# Altium integrated library My_Intlib.IntLib: 107 symbols (part 1 of 2) (continued)
## STM32F103V (continued)

## STM32F407ZE
designator U?
Flaah:512/RAM:192/IO:114; BOM名称: 32位ST单片机
footprint LQFP144 20X20_N (144脚，体宽20x20mm，脚距0.5mm)
pins: 1 FSMC_A23/PE2, 2 FSMC_A19/PE3, 3 FSMC_A20/PE4, 4 FSMC_A21/PE5, 5 FSMC_A22/PE6, 6 VBAT, 7 PC13, 8 PC14/OSC32_IN, 9 PC15/OSC32_OUT, 10 I2C2_SDA/FSMC_A0/PF0, 11 I2C2_SCL/FSMC_A1/PF1, 12 I2C2_SMBA/FSMC_A2/PF2, 13 FSMC_A3/PF3, 14 FSMC_A4/PF4, 15 FSMC_A5/PF5, 16 VSS, 17 VDD, 18 FSMC_NIORD/PF6, 19 FSMC_NREG/PF7, 20 FSMC_NIOWR/PF8, 21 FSMC_CD/PF9, 22 FSMC_INTR/PF10, 23 OSC_IN/PH0, 24 OSC_OUT/PH1, 25 NRST, 26 PC0, 27 PC1, 28 PC2/SPI2_MISO/I2S2ext_SD, 29 PC3/SPI2_MOSI/I2S2_SD, 30 VDD, 31 VSSA, 32 VREF+, 33 VDDA, 34 PA0/USART2_CTS/UART4_TX, 35 PA1/USART2_RTS/UART4_RX, 36 PA2/USART2_TX, 37 PA3/USART2_RX, 38 VSS, 39 VDD, 40 PA4/SPI1_NSS/SPI3_NSS/USART2_CK, 41 PA5/SPI1_SCK, 42 PA6/SPI1_MISO, 43 PA7/SPI1_MOSI, 44 PC4, 45 PC5, 46 PB0, 47 PB1, 48 PB2/BOOT1, 49 PF11, 50 FSMC_A6/PF12, 51 VSS, 52 VDD, 53 FSMC_A7/PF13, 54 FSMC_A8/PF14, 55 FSMC_A9/PF15, 56 FSMC_A10/PG0, 57 FSMC_A11/PG1, 58 FSMC_D4/PE7, 59 FSMC_D5/PE8, 60 FSMC_D6/PE9, 61 VSS, 62 VDD, 63 FSMC_D7/PE10, 64 FSMC_D8/PE11, 65 FSMC_D9/PE12, 66 FSMC_D10/PE13, 67 FSMC_D11/PE14, 68 FSMC_D12/PE15, 69 PB10/SPI2_SCK/I2S2_CK/I2C2_SCL/USART3_TX, 70 PB11/I2C2_SDA/USART3_RX, 71 VCAP_1, 72 VDD, 73 PB12/SPI2_NSS/I2S2_WS/I2C2_SMBA/USART3_CK/CNA2_RX, 74 PB13/SPI2_SCK/I2S2_CK/USART3_CTS/CAN2_TX, 75 PB14/SPI2_MISO/USART3_RTS, 76 PB15/SPI2_MOSI/I2S2_SD, 77 PD8/FSMC_D13/USART3_TX, 78 PD9/FSMC_D14/USART3_RX, 79 PD10/FSMC_D15/USART3_CK, 80 PD11/FSMC_CLE/FSMC_A16/USART3_CTS, 81 PD12/FSMC_ALE/FSMC_A17/USART3_RTS, 82 PD13/FSMC_A18, 83 VSS, 84 VDD, 85 PD14/FSMC_D0, 86 PD15/FSMC_D1, 87 FSMC_A12/PG2, 88 FSMC_A13/PG3, 89 FSMC_A14/PG4, 90 FSMC_A15/PG5, 91 FSMC_INT2/PG6, 92 USART6_CK/FSMC_INT3/PG7, 93 USART6_RTS/PG8, 94 VSS, 95 VDD, 96 PC6/I2S2_MCK/USART6_TX, 97 PC7/I2S3_MCK/USART6_RX, 98 PC8/USART6_CK, 99 PC9/I2S_CKIN/I2C3_SDA, 100 PA8/USART1_CK, 101 PA9/USART1_TX/I2C3_SMBA, 102 PA10/USART1_RX, 103 PA11/USART1_CTS/CAN1_RX, 104 PA12/USART1_RTS/CAN1_TX, 105 PA13/SWDIO, 106 VCAP_2, 107 VSS, 108 VDD, 109 PA14/SWCLK, 110 PA15/SPI3_NSS/I2S3_WS, 111 PC10/SPI3_SCK/I2S3_CK/UART4_TX/USART3_TX, 112 PC11/SPI3_MISO/I2S3ext_SD/UART4_RX/USART3_RX, 113 PC12/SPI3_MOSI/I2S3_SD/UART5_TX/USART3_CK, 114 PD0/FSMC_D2/CAN1_RX, 115 PD1/FSMC_D2/CAN1_TX, 116 PD2/UART5_RX, 117 PD3/FSMC_CLK/USART2_CTS, 118 PD4/FSMC_NOE/USART2_RTS, 119 PD5/FSMC_NWE/USART2_TX, 120 VSS, 121 VDD, 122 PD6/FSMC_NWAIT/USART2_RX, 123 PD7/FSMC_NE1/FSMC_NCE2/USART2_CK, 124 USART6_RX/FSMC_NE2/FSMC_NCE3/PG9, 125 FSMC_NCE4_1/FSMC_NE3/PG10, 126 FSMC_NCE4_2/PG11, 127 USART6_RTS/FSMC_NE4/PG12, 128 USART6_CTS/FSMC_A24/PG13, 129 USART6_TX/FSMC_A25/PG14, 130 VSS, 131 VDD, 132 USART6_CTS/PG15, 133 PB3/SPI3_SCK/I2S3_CK/SPI1_SCK, 134 PB4/SPI3_MISO/SPI1_MISO/I2S3ext_SD, 135 PB5/I2C1_SMBA/CAN2_RX/SPI1_MOSI/SPI3_MOSI/I2S3_SD, 136 PB6/I2C1_SCL/CAN2_TX/USART1_TX, 137 PB7/I2C1_SDA/FSMC_NL/USART1_RX, 138 BOOT0, 139 PB8/I2C1_SCL/CAN1_RX, 140 PB9/SPI2_NSS/I2S2_WS/I2C1_SDA/CAN1_TX, 141 FSMC_NBL0/PE0, 142 FSMC_NBL1/PE1, 143 PDR_ON, 144 VDD

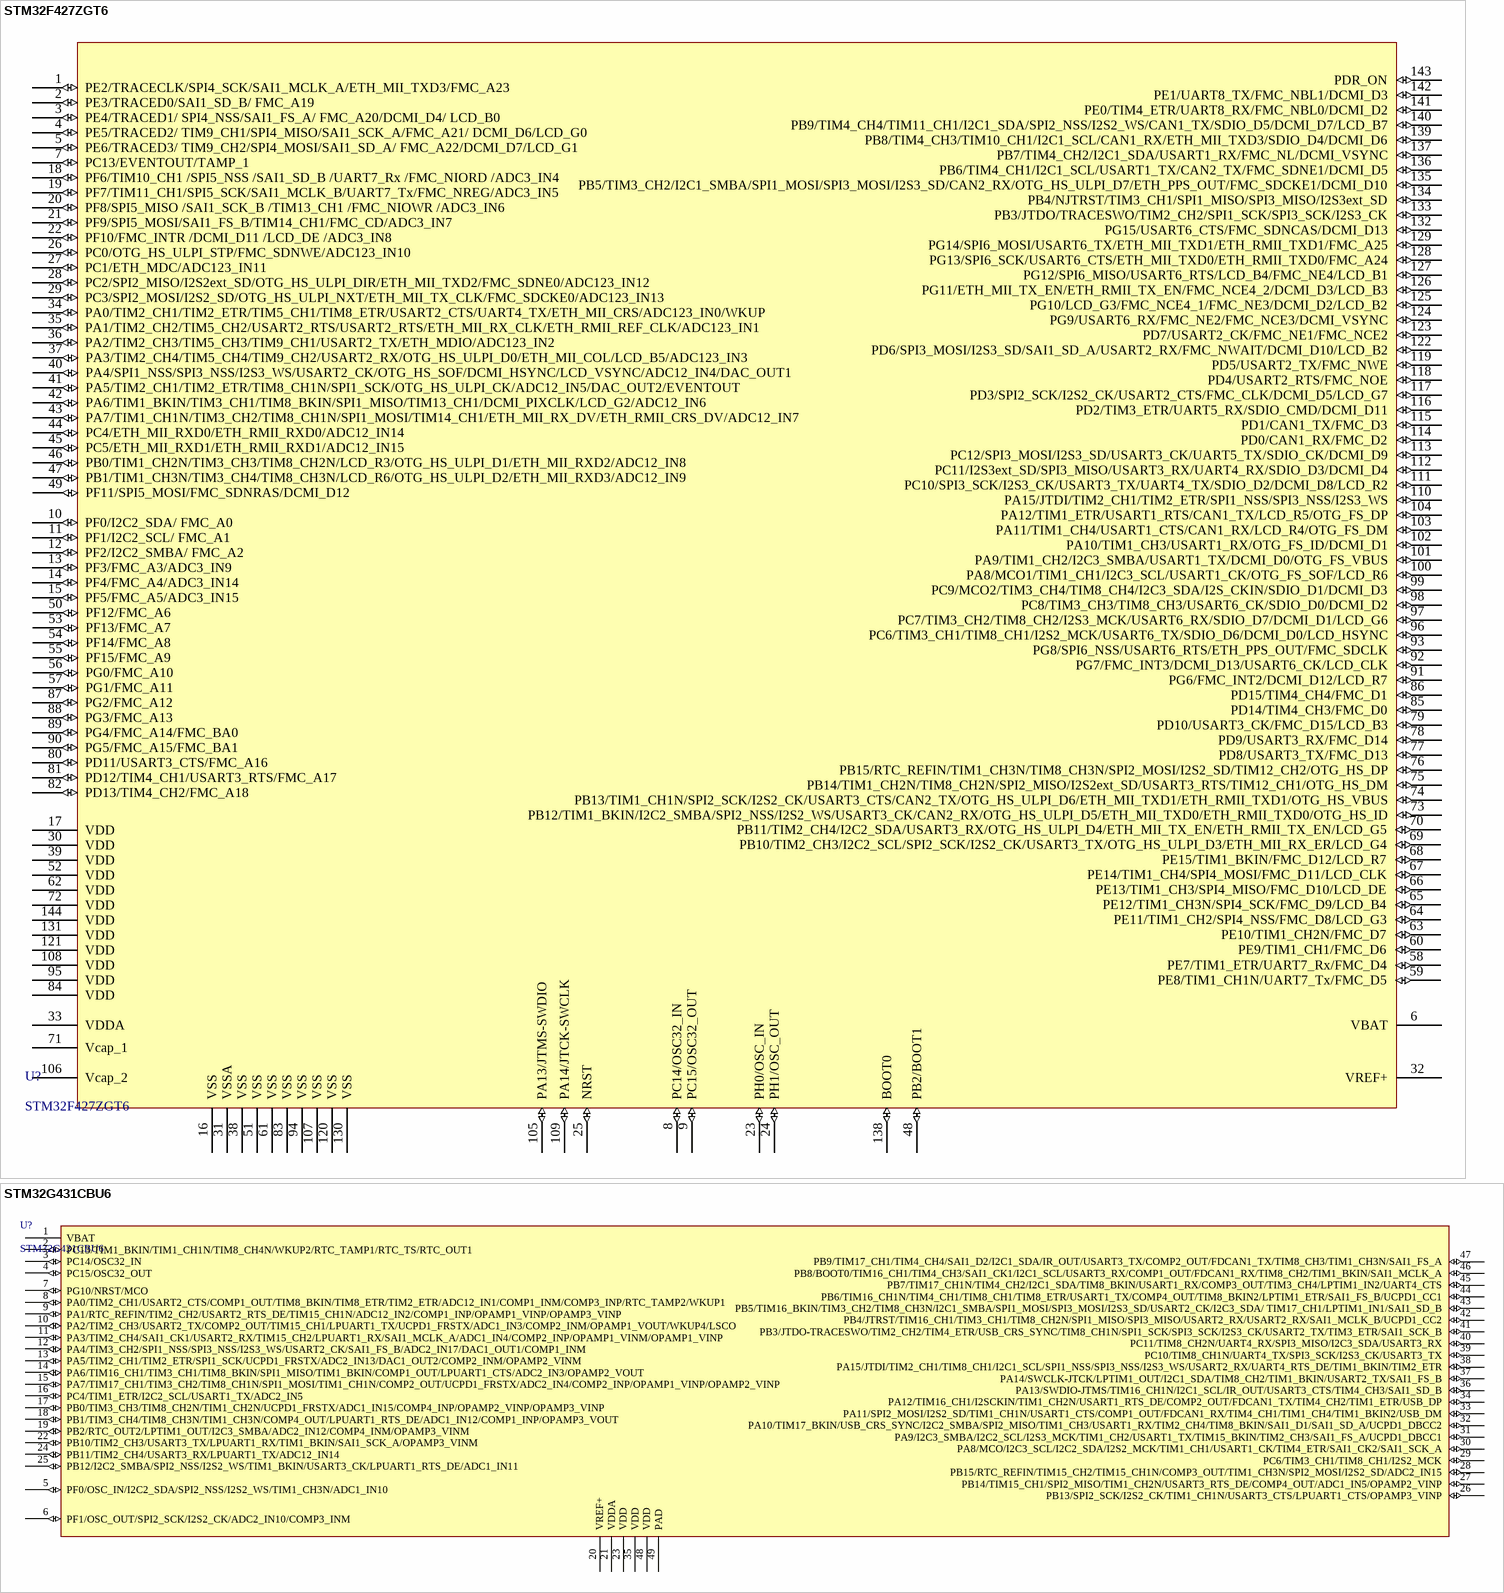
[diagram p6: symbols STM32F427ZGT6 to STM32G431CBU6]

## STM32F427ZGT6
designator U?
Flash:1024/RAM:256/IO:114/Speed:180MHz
footprint LQFP144 20X20_M (144脚，体宽20x20mm，脚距0.5mm)
pins: 1 PE2/TRACECLK/SPI4_SCK/SAI1_MCLK_A/ETH_MII_TXD3/FMC_A23 (io), 2 PE3/TRACED0/SAI1_SD_B/ FMC_A19 (io), 3 PE4/TRACED1/ SPI4_NSS/SAI1_FS_A/ FMC_A20/DCMI_D4/ LCD_B0 (io), 4 PE5/TRACED2/ TIM9_CH1/SPI4_MISO/SAI1_SCK_A/FMC_A21/ DCMI_D6/LCD_G0 (io), 5 PE6/TRACED3/ TIM9_CH2/SPI4_MOSI/SAI1_SD_A/ FMC_A22/DCMI_D7/LCD_G1 (io), 6 VBAT (power), 7 PC13/EVENTOUT/TAMP_1 (io), 8 PC14/OSC32_IN (io), 9 PC15/OSC32_OUT (io), 10 PF0/I2C2_SDA/ FMC_A0 (io), 11 PF1/I2C2_SCL/ FMC_A1 (io), 12 PF2/I2C2_SMBA/ FMC_A2 (io), 13 PF3/FMC_A3/ADC3_IN9 (io), 14 PF4/FMC_A4/ADC3_IN14 (io), 15 PF5/FMC_A5/ADC3_IN15 (io), 16 VSS (power), 17 VDD (power), 18 PF6/TIM10_CH1 /SPI5_NSS /SAI1_SD_B /UART7_Rx /FMC_NIORD /ADC3_IN4 (io), 19 PF7/TIM11_CH1/SPI5_SCK/SAI1_MCLK_B/UART7_Tx/FMC_NREG/ADC3_IN5 (io), 20 PF8/SPI5_MISO /SAI1_SCK_B /TIM13_CH1 /FMC_NIOWR /ADC3_IN6 (io), 21 PF9/SPI5_MOSI/SAI1_FS_B/TIM14_CH1/FMC_CD/ADC3_IN7 (io), 22 PF10/FMC_INTR /DCMI_D11 /LCD_DE /ADC3_IN8 (io), 23 PH0/OSC_IN (io), 24 PH1/OSC_OUT (io), 25 NRST (io), 26 PC0/OTG_HS_ULPI_STP/FMC_SDNWE/ADC123_IN10 (io), 27 PC1/ETH_MDC/ADC123_IN11 (io), 28 PC2/SPI2_MISO/I2S2ext_SD/OTG_HS_ULPI_DIR/ETH_MII_TXD2/FMC_SDNE0/ADC123_IN12 (io), 29 PC3/SPI2_MOSI/I2S2_SD/OTG_HS_ULPI_NXT/ETH_MII_TX_CLK/FMC_SDCKE0/ADC123_IN13 (io), 30 VDD (power), 31 VSSA (power), 32 VREF+ (power), 33 VDDA (power), 34 PA0/TIM2_CH1/TIM2_ETR/TIM5_CH1/TIM8_ETR/USART2_CTS/UART4_TX/ETH_MII_CRS/ADC123_IN0/WKUP (io), 35 PA1/TIM2_CH2/TIM5_CH2/USART2_RTS/USART2_RTS/ETH_MII_RX_CLK/ETH_RMII_REF_CLK/ADC123_IN1 (io), 36 PA2/TIM2_CH3/TIM5_CH3/TIM9_CH1/USART2_TX/ETH_MDIO/ADC123_IN2 (io), 37 PA3/TIM2_CH4/TIM5_CH4/TIM9_CH2/USART2_RX/OTG_HS_ULPI_D0/ETH_MII_COL/LCD_B5/ADC123_IN3 (io), 38 VSS (power), 39 VDD (power), 40 PA4/SPI1_NSS/SPI3_NSS/I2S3_WS/USART2_CK/OTG_HS_SOF/DCMI_HSYNC/LCD_VSYNC/ADC12_IN4/DAC_OUT1 (io), 41 PA5/TIM2_CH1/TIM2_ETR/TIM8_CH1N/SPI1_SCK/OTG_HS_ULPI_CK/ADC12_IN5/DAC_OUT2/EVENTOUT (io), 42 PA6/TIM1_BKIN/TIM3_CH1/TIM8_BKIN/SPI1_MISO/TIM13_CH1/DCMI_PIXCLK/LCD_G2/ADC12_IN6 (io), 43 PA7/TIM1_CH1N/TIM3_CH2/TIM8_CH1N/SPI1_MOSI/TIM14_CH1/ETH_MII_RX_DV/ETH_RMII_CRS_DV/ADC12_IN7 (io), 44 PC4/ETH_MII_RXD0/ETH_RMII_RXD0/ADC12_IN14 (io), 45 PC5/ETH_MII_RXD1/ETH_RMII_RXD1/ADC12_IN15 (io), 46 PB0/TIM1_CH2N/TIM3_CH3/TIM8_CH2N/LCD_R3/OTG_HS_ULPI_D1/ETH_MII_RXD2/ADC12_IN8 (io), 47 PB1/TIM1_CH3N/TIM3_CH4/TIM8_CH3N/LCD_R6/OTG_HS_ULPI_D2/ETH_MII_RXD3/ADC12_IN9 (io), 48 PB2/BOOT1 (io), 49 PF11/SPI5_MOSI/FMC_SDNRAS/DCMI_D12 (io), 50 PF12/FMC_A6 (io), 51 VSS (power), 52 VDD (power), 53 PF13/FMC_A7 (io), 54 PF14/FMC_A8 (io), 55 PF15/FMC_A9 (io), 56 PG0/FMC_A10 (io), 57 PG1/FMC_A11 (io), 58 PE7/TIM1_ETR/UART7_Rx/FMC_D4 (io), 59 PE8/TIM1_CH1N/UART7_Tx/FMC_D5 (io), 60 PE9/TIM1_CH1/FMC_D6 (io), 61 VSS (power), 62 VDD (power), 63 PE10/TIM1_CH2N/FMC_D7 (io), 64 PE11/TIM1_CH2/SPI4_NSS/FMC_D8/LCD_G3 (io), 65 PE12/TIM1_CH3N/SPI4_SCK/FMC_D9/LCD_B4 (io), 66 PE13/TIM1_CH3/SPI4_MISO/FMC_D10/LCD_DE (io), 67 PE14/TIM1_CH4/SPI4_MOSI/FMC_D11/LCD_CLK (io), 68 PE15/TIM1_BKIN/FMC_D12/LCD_R7 (io), 69 PB10/TIM2_CH3/I2C2_SCL/SPI2_SCK/I2S2_CK/USART3_TX/OTG_HS_ULPI_D3/ETH_MII_RX_ER/LCD_G4 (io), 70 PB11/TIM2_CH4/I2C2_SDA/USART3_RX/OTG_HS_ULPI_D4/ETH_MII_TX_EN/ETH_RMII_TX_EN/LCD_G5 (io), 71 Vcap_1 (power), 72 VDD (power), 73 PB12/TIM1_BKIN/I2C2_SMBA/SPI2_NSS/I2S2_WS/USART3_CK/CAN2_RX/OTG_HS_ULPI_D5/ETH_MII_TXD0/ETH_RMII_TXD0/OTG_HS_ID (io), 74 PB13/TIM1_CH1N/SPI2_SCK/I2S2_CK/USART3_CTS/CAN2_TX/OTG_HS_ULPI_D6/ETH_MII_TXD1/ETH_RMII_TXD1/OTG_HS_VBUS (io), 75 PB14/TIM1_CH2N/TIM8_CH2N/SPI2_MISO/I2S2ext_SD/USART3_RTS/TIM12_CH1/OTG_HS_DM (io), 76 PB15/RTC_REFIN/TIM1_CH3N/TIM8_CH3N/SPI2_MOSI/I2S2_SD/TIM12_CH2/OTG_HS_DP (io), 77 PD8/USART3_TX/FMC_D13 (io), 78 PD9/USART3_RX/FMC_D14 (io), 79 PD10/USART3_CK/FMC_D15/LCD_B3 (io), 80 PD11/USART3_CTS/FMC_A16 (io), 81 PD12/TIM4_CH1/USART3_RTS/FMC_A17 (io), 82 PD13/TIM4_CH2/FMC_A18 (io), 83 VSS (power), 84 VDD (power), 85 PD14/TIM4_CH3/FMC_D0 (io), 86 PD15/TIM4_CH4/FMC_D1 (io), 87 PG2/FMC_A12 (io), 88 PG3/FMC_A13 (io), 89 PG4/FMC_A14/FMC_BA0 (io), 90 PG5/FMC_A15/FMC_BA1 (io), 91 PG6/FMC_INT2/DCMI_D12/LCD_R7 (io), 92 PG7/FMC_INT3/DCMI_D13/USART6_CK/LCD_CLK (io), 93 PG8/SPI6_NSS/USART6_RTS/ETH_PPS_OUT/FMC_SDCLK (io), 94 VSS (power), 95 VDD (power), 96 PC6/TIM3_CH1/TIM8_CH1/I2S2_MCK/USART6_TX/SDIO_D6/DCMI_D0/LCD_HSYNC (io), 97 PC7/TIM3_CH2/TIM8_CH2/I2S3_MCK/USART6_RX/SDIO_D7/DCMI_D1/LCD_G6 (io), 98 PC8/TIM3_CH3/TIM8_CH3/USART6_CK/SDIO_D0/DCMI_D2 (io), 99 PC9/MCO2/TIM3_CH4/TIM8_CH4/I2C3_SDA/I2S_CKIN/SDIO_D1/DCMI_D3 (io), 100 PA8/MCO1/TIM1_CH1/I2C3_SCL/USART1_CK/OTG_FS_SOF/LCD_R6 (io), 101 PA9/TIM1_CH2/I2C3_SMBA/USART1_TX/DCMI_D0/OTG_FS_VBUS (io), 102 PA10/TIM1_CH3/USART1_RX/OTG_FS_ID/DCMI_D1 (io), 103 PA11/TIM1_CH4/USART1_CTS/CAN1_RX/LCD_R4/OTG_FS_DM (io), 104 PA12/TIM1_ETR/USART1_RTS/CAN1_TX/LCD_R5/OTG_FS_DP (io), 105 PA13/JTMS-SWDIO (io), 106 Vcap_2 (power), 107 VSS (power), 108 VDD (power), 109 PA14/JTCK-SWCLK (io), 110 PA15/JTDI/TIM2_CH1/TIM2_ETR/SPI1_NSS/SPI3_NSS/I2S3_WS (io), 111 PC10/SPI3_SCK/I2S3_CK/USART3_TX/UART4_TX/SDIO_D2/DCMI_D8/LCD_R2 (io), 112 PC11/I2S3ext_SD/SPI3_MISO/USART3_RX/UART4_RX/SDIO_D3/DCMI_D4 (io), 113 PC12/SPI3_MOSI/I2S3_SD/USART3_CK/UART5_TX/SDIO_CK/DCMI_D9 (io), 114 PD0/CAN1_RX/FMC_D2 (io), 115 PD1/CAN1_TX/FMC_D3 (io), 116 PD2/TIM3_ETR/UART5_RX/SDIO_CMD/DCMI_D11 (io), 117 PD3/SPI2_SCK/I2S2_CK/USART2_CTS/FMC_CLK/DCMI_D5/LCD_G7 (io), 118 PD4/USART2_RTS/FMC_NOE (io), 119 PD5/USART2_TX/FMC_NWE (io), 120 VSS (power), 121 VDD (power), 122 PD6/SPI3_MOSI/I2S3_SD/SAI1_SD_A/USART2_RX/FMC_NWAIT/DCMI_D10/LCD_B2 (io), 123 PD7/USART2_CK/FMC_NE1/FMC_NCE2 (io), 124 PG9/USART6_RX/FMC_NE2/FMC_NCE3/DCMI_VSYNC (io), 125 PG10/LCD_G3/FMC_NCE4_1/FMC_NE3/DCMI_D2/LCD_B2 (io), 126 PG11/ETH_MII_TX_EN/ETH_RMII_TX_EN/FMC_NCE4_2/DCMI_D3/LCD_B3 (io), 127 PG12/SPI6_MISO/USART6_RTS/LCD_B4/FMC_NE4/LCD_B1 (io), 128 PG13/SPI6_SCK/USART6_CTS/ETH_MII_TXD0/ETH_RMII_TXD0/FMC_A24 (io), 129 PG14/SPI6_MOSI/USART6_TX/ETH_MII_TXD1/ETH_RMII_TXD1/FMC_A25 (io), 130 VSS (power), 131 VDD (power), 132 PG15/USART6_CTS/FMC_SDNCAS/DCMI_D13 (io), 133 PB3/JTDO/TRACESWO/TIM2_CH2/SPI1_SCK/SPI3_SCK/I2S3_CK (io), 134 PB4/NJTRST/TIM3_CH1/SPI1_MISO/SPI3_MISO/I2S3ext_SD (io), 135 PB5/TIM3_CH2/I2C1_SMBA/SPI1_MOSI/SPI3_MOSI/I2S3_SD/CAN2_RX/OTG_HS_ULPI_D7/ETH_PPS_OUT/FMC_SDCKE1/DCMI_D10 (io), 136 PB6/TIM4_CH1/I2C1_SCL/USART1_TX/CAN2_TX/FMC_SDNE1/DCMI_D5 (io), 137 PB7/TIM4_CH2/I2C1_SDA/USART1_RX/FMC_NL/DCMI_VSYNC (io), 138 BOOT0 (io), 139 PB8/TIM4_CH3/TIM10_CH1/I2C1_SCL/CAN1_RX/ETH_MII_TXD3/SDIO_D4/DCMI_D6 (io), 140 PB9/TIM4_CH4/TIM11_CH1/I2C1_SDA/SPI2_NSS/I2S2_WS/CAN1_TX/SDIO_D5/DCMI_D7/LCD_B7 (io), 141 PE0/TIM4_ETR/UART8_RX/FMC_NBL0/DCMI_D2 (io), 142 PE1/UART8_TX/FMC_NBL1/DCMI_D3 (io), 143 PDR_ON (io), 144 VDD (power)

## STM32G431CBU6
designator U?
Flash:128KB/RAM:32KB/IO:48/Speed:170MHz
footprint QFN50P700X700X90-49N-D
pins: 1 VBAT (power), 2 PC13/TIM1_BKIN/TIM1_CH1N/TIM8_CH4N/WKUP2/RTC_TAMP1/RTC_TS/RTC_OUT1 (io), 3 PC14/OSC32_IN (io), 4 PC15/OSC32_OUT (io), 5 PF0/OSC_IN/I2C2_SDA/SPI2_NSS/I2S2_WS/TIM1_CH3N/ADC1_IN10 (io), 6 PF1/OSC_OUT/SPI2_SCK/I2S2_CK/ADC2_IN10/COMP3_INM (io), 7 PG10/NRST/MCO (io), 8 PA0/TIM2_CH1/USART2_CTS/COMP1_OUT/TIM8_BKIN/TIM8_ETR/TIM2_ETR/ADC12_IN1/COMP1_INM/COMP3_INP/RTC_TAMP2/WKUP1 (io), 9 PA1/RTC_REFIN/TIM2_CH2/USART2_RTS_DE/TIM15_CH1N/ADC12_IN2/COMP1_INP/OPAMP1_VINP/OPAMP3_VINP (io), 10 PA2/TIM2_CH3/USART2_TX/COMP2_OUT/TIM15_CH1/LPUART1_TX/UCPD1_FRSTX/ADC1_IN3/COMP2_INM/OPAMP1_VOUT/WKUP4/LSCO (io), 11 PA3/TIM2_CH4/SAI1_CK1/USART2_RX/TIM15_CH2/LPUART1_RX/SAI1_MCLK_A/ADC1_IN4/COMP2_INP/OPAMP1_VINM/OPAMP1_VINP (io), 12 PA4/TIM3_CH2/SPI1_NSS/SPI3_NSS/I2S3_WS/USART2_CK/SAI1_FS_B/ADC2_IN17/DAC1_OUT1/COMP1_INM (io), 13 PA5/TIM2_CH1/TIM2_ETR/SPI1_SCK/UCPD1_FRSTX/ADC2_IN13/DAC1_OUT2/COMP2_INM/OPAMP2_VINM (io), 14 PA6/TIM16_CH1/TIM3_CH1/TIM8_BKIN/SPI1_MISO/TIM1_BKIN/COMP1_OUT/LPUART1_CTS/ADC2_IN3/OPAMP2_VOUT (io), 15 PA7/TIM17_CH1/TIM3_CH2/TIM8_CH1N/SPI1_MOSI/TIM1_CH1N/COMP2_OUT/UCPD1_FRSTX/ADC2_IN4/COMP2_INP/OPAMP1_VINP/OPAMP2_VINP (io), 16 PC4/TIM1_ETR/I2C2_SCL/USART1_TX/ADC2_IN5 (io), 17 PB0/TIM3_CH3/TIM8_CH2N/TIM1_CH2N/UCPD1_FRSTX/ADC1_IN15/COMP4_INP/OPAMP2_VINP/OPAMP3_VINP (io), 18 PB1/TIM3_CH4/TIM8_CH3N/TIM1_CH3N/COMP4_OUT/LPUART1_RTS_DE/ADC1_IN12/COMP1_INP/OPAMP3_VOUT (io), 19 PB2/RTC_OUT2/LPTIM1_OUT/I2C3_SMBA/ADC2_IN12/COMP4_INM/OPAMP3_VINM (io), 20 VREF+ (power), 21 VDDA (power), 22 PB10/TIM2_CH3/USART3_TX/LPUART1_RX/TIM1_BKIN/SAI1_SCK_A/OPAMP3_VINM (io), 23 VDD (power), 24 PB11/TIM2_CH4/USART3_RX/LPUART1_TX/ADC12_IN14 (io), 25 PB12/I2C2_SMBA/SPI2_NSS/I2S2_WS/TIM1_BKIN/USART3_CK/LPUART1_RTS_DE/ADC1_IN11 (io), 26 PB13/SPI2_SCK/I2S2_CK/TIM1_CH1N/USART3_CTS/LPUART1_CTS/OPAMP3_VINP (io), 27 PB14/TIM15_CH1/SPI2_MISO/TIM1_CH2N/USART3_RTS_DE/COMP4_OUT/ADC1_IN5/OPAMP2_VINP (io), 28 PB15/RTC_REFIN/TIM15_CH2/TIM15_CH1N/COMP3_OUT/TIM1_CH3N/SPI2_MOSI/I2S2_SD/ADC2_IN15 (io), 29 PC6/TIM3_CH1/TIM8_CH1/I2S2_MCK (io), 30 PA8/MCO/I2C3_SCL/I2C2_SDA/I2S2_MCK/TIM1_CH1/USART1_CK/TIM4_ETR/SAI1_CK2/SAI1_SCK_A (io), 31 PA9/I2C3_SMBA/I2C2_SCL/I2S3_MCK/TIM1_CH2/USART1_TX/TIM15_BKIN/TIM2_CH3/SAI1_FS_A/UCPD1_DBCC1 (io), 32 PA10/TIM17_BKIN/USB_CRS_SYNC/I2C2_SMBA/SPI2_MISO/TIM1_CH3/USART1_RX/TIM2_CH4/TIM8_BKIN/SAI1_D1/SAI1_SD_A/UCPD1_DBCC2 (io), 33 PA11/SPI2_MOSI/I2S2_SD/TIM1_CH1N/USART1_CTS/COMP1_OUT/FDCAN1_RX/TIM4_CH1/TIM1_CH4/TIM1_BKIN2/USB_DM (io), 34 PA12/TIM16_CH1/I2SCKIN/TIM1_CH2N/USART1_RTS_DE/COMP2_OUT/FDCAN1_TX/TIM4_CH2/TIM1_ETR/USB_DP (io), 35 VDD (power), 36 PA13/SWDIO-JTMS/TIM16_CH1N/I2C1_SCL/IR_OUT/USART3_CTS/TIM4_CH3/SAI1_SD_B (io), 37 PA14/SWCLK-JTCK/LPTIM1_OUT/I2C1_SDA/TIM8_CH2/TIM1_BKIN/USART2_TX/SAI1_FS_B (io), 38 PA15/JTDI/TIM2_CH1/TIM8_CH1/I2C1_SCL/SPI1_NSS/SPI3_NSS/I2S3_WS/USART2_RX/UART4_RTS_DE/TIM1_BKIN/TIM2_ETR (io), 39 PC10/TIM8_CH1N/UART4_TX/SPI3_SCK/I2S3_CK/USART3_TX (io), 40 PC11/TIM8_CH2N/UART4_RX/SPI3_MISO/I2C3_SDA/USART3_RX (io), 41 PB3/JTDO-TRACESWO/TIM2_CH2/TIM4_ETR/USB_CRS_SYNC/TIM8_CH1N/SPI1_SCK/SPI3_SCK/I2S3_CK/USART2_TX/TIM3_ETR/SAI1_SCK_B (io), 42 PB4/JTRST/TIM16_CH1/TIM3_CH1/TIM8_CH2N/SPI1_MISO/SPI3_MISO/USART2_RX/USART2_RX/SAI1_MCLK_B/UCPD1_CC2 (io), 43 PB5/TIM16_BKIN/TIM3_CH2/TIM8_CH3N/I2C1_SMBA/SPI1_MOSI/SPI3_MOSI/I2S3_SD/USART2_CK/I2C3_SDA/ TIM17_CH1/LPTIM1_IN1/SAI1_SD_B (io), 44 PB6/TIM16_CH1N/TIM4_CH1/TIM8_CH1/TIM8_ETR/USART1_TX/COMP4_OUT/TIM8_BKIN2/LPTIM1_ETR/SAI1_FS_B/UCPD1_CC1 (io), 45 PB7/TIM17_CH1N/TIM4_CH2/I2C1_SDA/TIM8_BKIN/USART1_RX/COMP3_OUT/TIM3_CH4/LPTIM1_IN2/UART4_CTS (io), 46 PB8/BOOT0/TIM16_CH1/TIM4_CH3/SAI1_CK1/I2C1_SCL/USART3_RX/COMP1_OUT/FDCAN1_RX/TIM8_CH2/TIM1_BKIN/SAI1_MCLK_A (io), 47 PB9/TIM17_CH1/TIM4_CH4/SAI1_D2/I2C1_SDA/IR_OUT/USART3_TX/COMP2_OUT/FDCAN1_TX/TIM8_CH3/TIM1_CH3N/SAI1_FS_A (io), 48 VDD (power), 49 PAD (power)

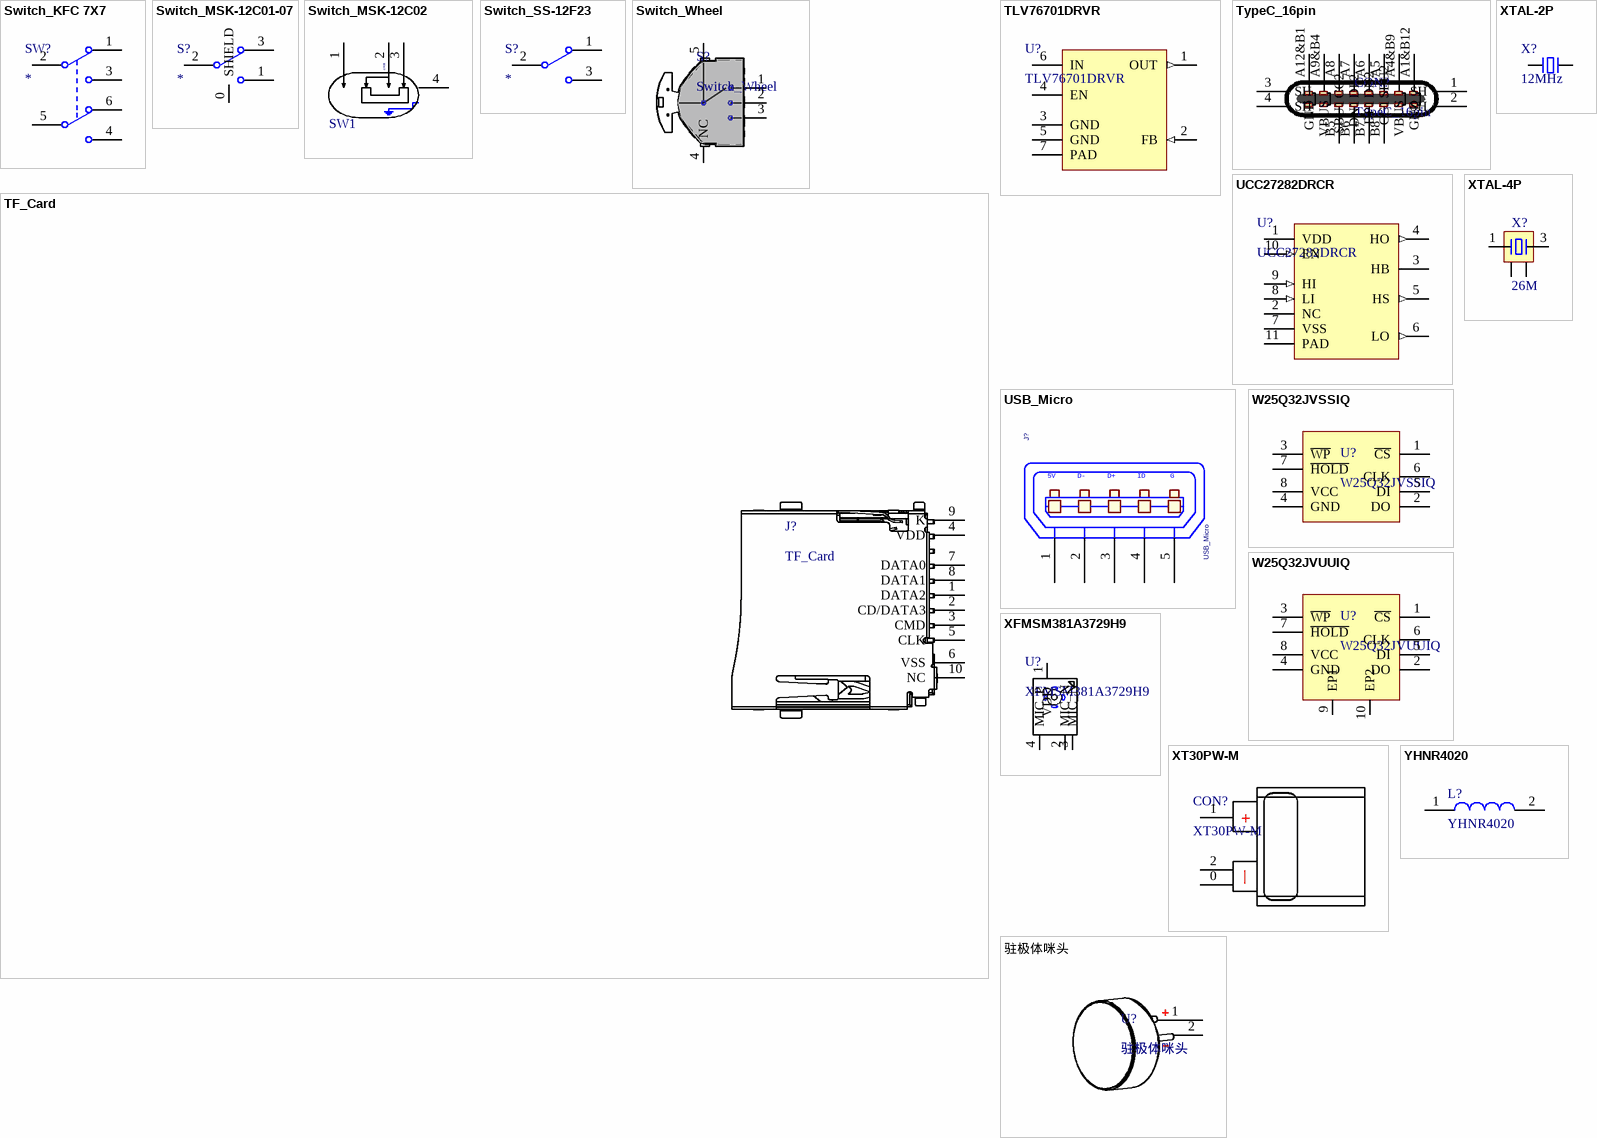
[diagram p7: symbols Switch_KFC 7X7 to 驻极体咪头]

## Switch_KFC 7X7
designator SW?
7*7自锁开关; 版权归属: 源创客; BOM名称: 7*7自锁开关; 学习资源: www.ooocke.com
footprint KFC DIP-7X7 (自锁开关，规格：7*7mm)
pins: 1 NC1, 2 COM2, 3 NO1, 4 NO2, 5 COM2, 6 NC2

## Switch_MSK-12C01-07
designator S?
footprint MSK-12C01-07
pins: 0 SHIELD, 1, 2, 3

## Switch_MSK-12C02
designator SW1  (value not drawn)
电路结构:单刀双掷;安装方式:卧贴;开关颜色:-;额定电流(DC):50mA;额定电压(DC):12V;额定电流(AC):-;额定电压(AC):-;机械寿命:1万次;; Manufacturer: SHOU HAN(首韩); Name: MSK12C02; Add into BOM: yes; Circuit: 单刀双掷; Pin Style: SMD接片; Switch Length: 8mm; Switch Width: 2.8mm; Switch Height: 1.4mm; Current Rating (DC): 50mA; Voltage Rating (DC): 12V; Mechanical Life: 1万次; Symbol: MSK12C02; Device: MSK12C02; LCSC Part Name: 两档侧拨贴片 7脚 滑动开关; Supplier Part: C431540; Manufacturer Part: MSK12C02; Supplier Footprint: SMD; JLCPCB Part Class: 扩展库; Datasheet: https://atta.szlcsc.com/upload/public/pdf/source/20190925/C431540_89155AEF0758B9AD1B2D805F83FB12E3.pdf; Supplier: LCSC; Convert to PCB: yes; Actuator Style: -; Mounting Style: 卧贴; Actuator Color: -; Current Rating (AC): -; Voltage Rating (AC): -; Operating Temperature: -20℃~+70℃
footprint SW-TH_MSK12C02
pins: 1, 2, 3, 4
text: 公共端

## Switch_SS-12F23
designator S?
footprint SS-12F23
pins: 1, 2, 3

## Switch_Wheel
designator S?
拨轮开关，3脚，11.8mm*11.8mm*2.4mm
footprint Switch_Wheel (拨轮开关，3脚，11.8mm*11.8mm*2.4mm)
pins: 1, 2, 3, 4 NC, 5

## TF_Card
designator J?
TF卡座; 版权归属: 源创客; BOM名称: TF卡座; 学习资源: www.ooocke.com
footprint Micro SD
footprint TF-027-H300 (拔插式 MicroSD卡(TF卡) 卡座3mm高 / HANBO(汉博))
pins: 1 DATA2, 2 CD/DATA3, 3 CMD, 4 VDD, 5 CLK, 6 VSS, 7 DATA0, 8 DATA1, 9 K, 10 NC

## TLV76701DRVR
designator U?
TI的线性稳压器，具有可调节输出和固定输出的 1A、16V 正电压低压降 (LDO) 线性稳压器
footprint WSON-6
pins: 1 OUT (out), 2 FB (in), 3 GND (power), 4 EN (power), 5 GND (power), 6 IN (power), 7 PAD (power)

## TypeC_16pin
designator CON?
TYPE-CF-16P-RAT-L7.5W
footprint TypeC_16pin (TypeC_16pin接口)
footprint TypeC_16pin无定位柱 (TypeC_16pin接口)
pins: 1 SH, 2 SH, 3 SH, 4 SH, A1&B12 GND, A4&B9 VBUS, A5 CC1, A6 DP1, A7 DN1, A8 SBU1, A9&B4 VBUS, A12&B1 GND, B5 CC2, B6 DP2, B7 DN2, B8 SBU2

## UCC27282DRCR
designator U?
TI的半桥栅极驱动器，具有 5V UVLO、互锁和使能功能的 3A、120V
footprint VSON-10
pins: 1 VDD (power), 2 NC (hiz), 3 HB, 4 HO (out), 5 HS (out), 6 LO (out), 7 VSS (power), 8 LI (in), 9 HI (in), 10 EN (in), 11 PAD (power)

## USB_Micro
designator J?
CLASS: IO; AGILE_PN: 211-80104; MFG_NAME01: ANYTRONIC CORPORATION LIMITED; MFG_PN01: 23970101#LCP-58LF; Temp_Range: -55&#8451; to 105&#8451;; CAD_APPROVED: Yes; ROHS: Yes; HEIGHT: 2.8MM
footprint USB-MICRO (micro型USB ，6.7*7.5*2.5mm)
pins: 1 P1, 2 P2, 3 P3, 4 P4, 5 P5
text: 5V; D-; D+; ID; G

## W25Q32JVSSIQ
designator U?
FLASH闪存芯片 32MBIT，4M存储容量 / SOIC-8 ，3V3供电
footprint SOP8W_N (5.3*8.3*1.8mm（长宽高）)
pins: 1 ~{CS}, 2 DO, 3 ~{WP}, 4 GND, 5 DI, 6 CLK, 7 ~{HOLD}, 8 VCC

## W25Q32JVUUIQ
designator U?
FLASH闪存芯片 32MBIT，4M存储容量 / USON-8(3x4) ，3V3供电
footprint USON-8(3x4) (4*3*0.55mm(长宽高))
pins: 1 ~{CS}, 2 DO, 3 ~{WP}, 4 GND, 5 DI, 6 CLK, 7 ~{HOLD}, 8 VCC, 9 EP1, 10 EP2

## XFMSM381A3729H9
designator U?
敏芯微3729模拟信号硅麦，灵敏度-38dB，响应频率100~10000Hz，进音方式上进音 / 尺寸3.76mm*2.95mm*1.1mm
footprint 硅麦3.76*2.95*1.1 (模拟硅麦，尺寸3.76mm*2.95mm*1.1mm)
pins: 1 VDD, 2 MIC_N, 3 MIC_N, 4 MIC_P

## XT30PW-M
designator CON?
XT30PW-M公头，15A，航模插头连接器大电流
footprint XT30PW-M (XT30PW-M公头，15A，航模插头连接器大电流)
pins: 0, 1, 2
text: +; —